# Altium footprint library THT_CON.PcbLib: 48 footprints (part 3 of 3)
Each footprint in its own frame and in the unit in brackets; x right, y up, seen from the top. Pads: shape width x height; smd on the part's side, far side on the other; paste and mask are expansions set on the pad; w line width, h text height; cw(c..) or ccw(c..) is an arc to the next point about the centre after c.
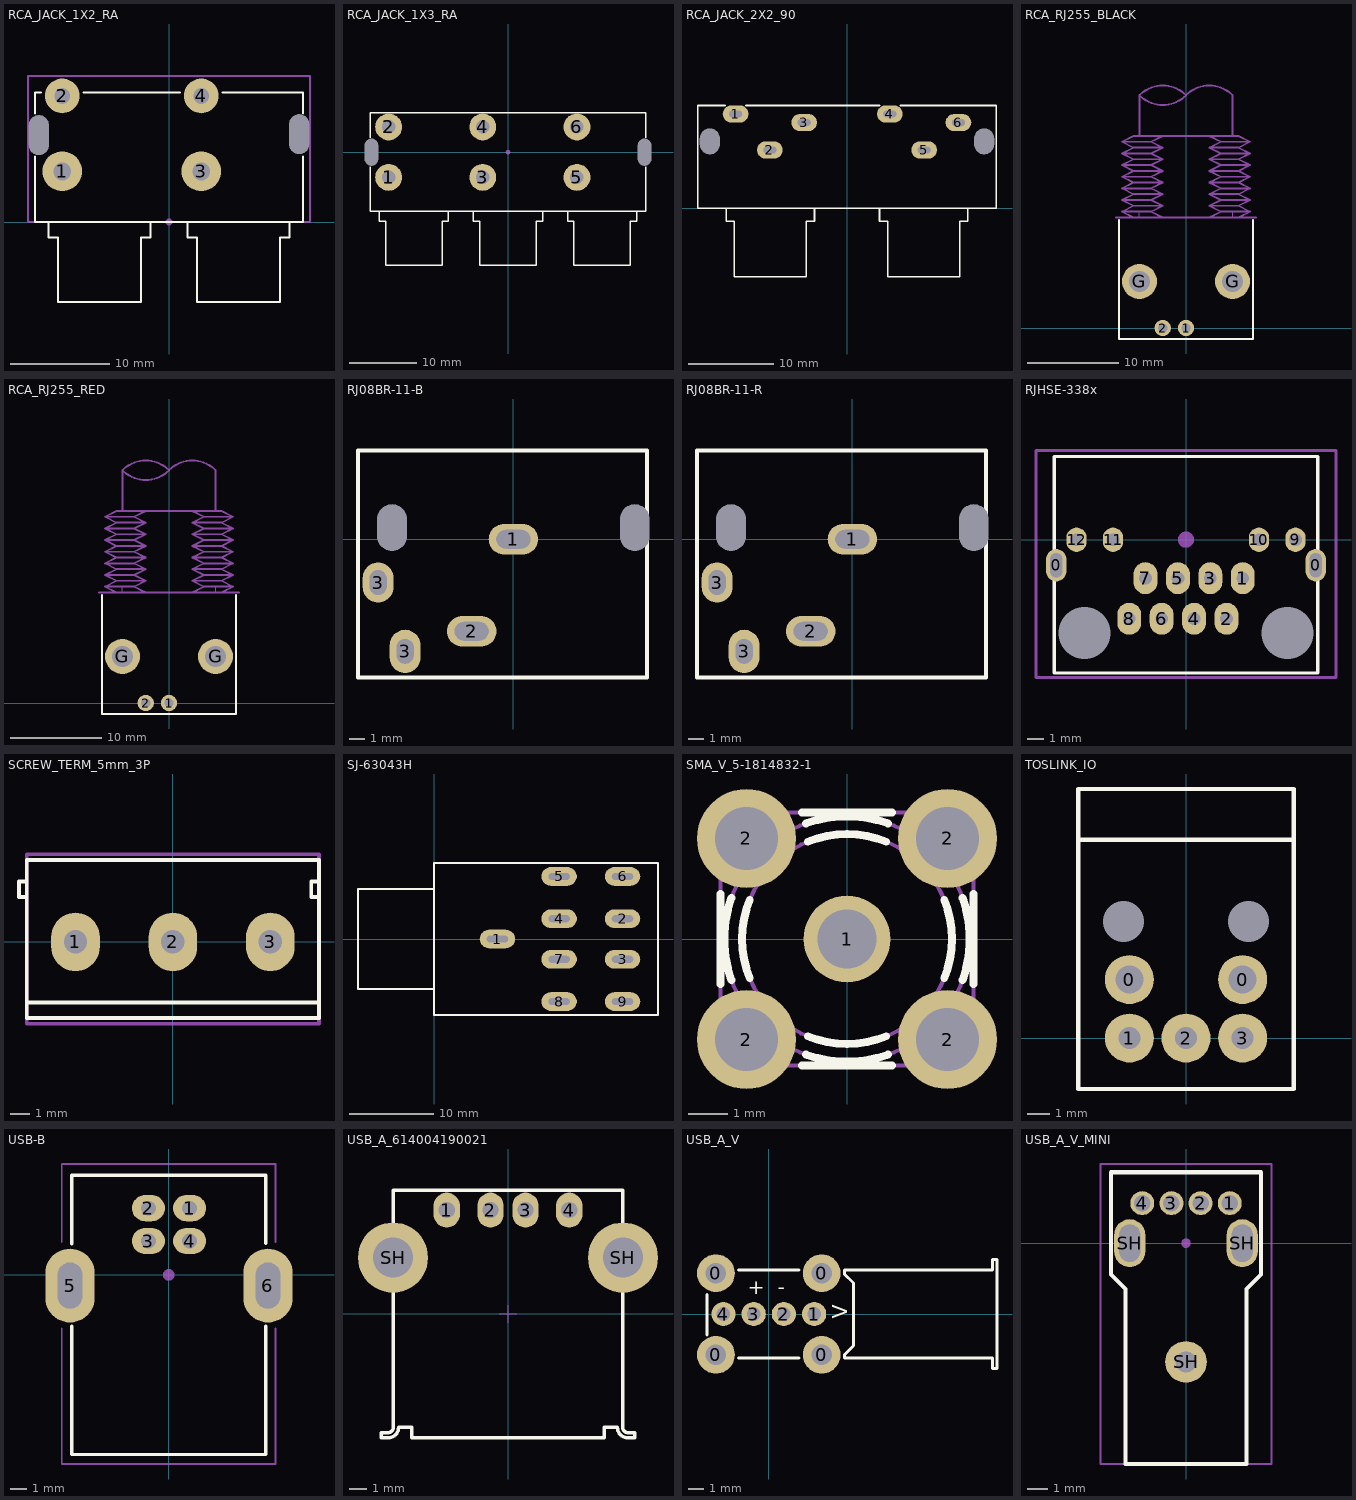
[diagram p2: the footprints below, top view; thin cyan lines are the x and y axes]

## RCA_JACK_1X2_RA [mm]
pads (6):
  round 4 hole 1.8: 1(-10.75,5.1) 3(3.25,5.1)
  round 3.5 hole 1.6: 2(-10.75,12.7) 4(3.25,12.7)
  round 0 hole 2 slot 4 at 90 deg unplated: 34(-13.1,8.75) 34(13.1,8.85)
Top Overlay:
  lines w0.2: -13.5,6.6 -13.5,0 13.5,0 13.5,6.6 ; -13.5,10.9 -13.5,13.05 -12.9,13.05 ; -12.15,-0.05 -12.15,-1.55 -11.192,-1.55 -11.192,-8.05 -2.808,-8.05 -2.808,-1.55 -1.85,-1.55 -1.85,-0.05 ; -8.6,13.05 1.1,13.05 ; 1.85,-0.05 1.85,-1.55 2.808,-1.55 2.808,-8.05 11.192,-8.05 11.192,-1.55 12.15,-1.55 12.15,-0.05 ; 5.4,13.05 13.5,13.05 13.5,10.9
Mechanical 15:
  circle w0.4: c0,0 r0.141
  lines w0.2: -0.141,0 14.2,0 14.2,14.7 -14.2,14.7 -14.2,0 0.141,0
3D body "AV2-8.4-14.STEP": height 16.75, standoff -4.5, extent -13.5,-7.975 13.5,13.025

## RCA_JACK_1X3_RA [mm]
pads (8):
  round 4 hole 2: 1(-17.75,-3.75) 2(-17.75,3.75) 3(-3.75,-3.75) 4(-3.75,3.75) 5(10.25,-3.75) 6(10.25,3.75)
  round 0 hole 2 slot 4 at 90 deg unplated: 34(-20.3,0) 34(20.3,0)
Top Overlay:
  lines w0.2: -20.5,-2.15 -20.5,-8.75 20.5,-8.75 20.5,-2.15 ; -20.5,2.15 -20.5,5.85 20.5,5.85 20.5,2.15 ; -19.15,-8.8 -19.15,-10.3 -18.192,-10.3 -18.192,-16.8 -9.808,-16.8 -9.808,-10.3 -8.85,-10.3 -8.85,-8.8 ; -5.15,-8.8 -5.15,-10.3 -4.192,-10.3 -4.192,-16.8 4.192,-16.8 4.192,-10.3 5.15,-10.3 5.15,-8.8 ; 8.85,-8.8 8.85,-10.3 9.808,-10.3 9.808,-16.8 18.192,-16.8 18.192,-10.3 19.15,-10.3 19.15,-8.8
Mechanical 15:
  circle w0.4: c0,0 r0.141
3D body "CON_RCA_3_PIN_white.STEP": height 16.5, standoff -4, extent -20.5,-16.85 20.5,5.85

## RCA_JACK_2X2_90 [mm] "RS-409, PSG01551 and similar"
pads (8):
  round 0 hole 2.3 slot 3 at 90 deg: 0(-16,7.8) 0(16,7.8)
  oval 3x2 hole 0.8 slot 1.5 at 0 deg: 1(-13,11) 2(-9,6.8) 3(-5,10) 4(5,11) 5(9,6.8) 6(13,10)
Top Overlay:
  lines w0.2: -14.2,12 -17.4,12 -17.4,0 17.4,0 17.4,12 6.2,12 ; -14.1,0 -14.1,-1.5 -13.142,-1.5 -13.142,-8 -4.758,-8 -4.758,-1.5 -3.8,-1.5 -3.8,0 ; -11.8,12 3.8,12 ; 3.8,0 3.8,-1.5 4.758,-1.5 4.758,-8 13.142,-8 13.142,-1.5 14.1,-1.5 14.1,0
3D body "RS-409-gold.step": height 27.2, standoff -4.8, extent -17.4,-8 17.4,12

## RCA_RJ255_BLACK [mil]
height 31.5
pads (4):
  round 70 hole 40: 1(0,0) 2(-100,0)
  round 150 hole 90: G(-200,200) G(200,200)
Top Overlay:
  lines w7.87: -287.4,464.57 -287.4,-47.24 287.4,-47.24 287.4,464.57
Mechanical 15:
  lines w4: -300,475 -100,475 ; -200,475 -200,500 ; -125,475 300,475 ; 200,475 200,500
  lines w8: -300,475 300,475 ; -225,475 -275,500 ; -200.17,999.83 ccw(c-100,1100) 0.17,999.83 ; -200.17,1000.17 cw(c-100,900) 0.17,1000.17 ; -200,825 -200,1000 ; -100,475 -150,500 ; -0.17,1000.17 cw(c100,900) 200.17,1000.17 ; 100,475 150,500 ; 200,825 200,1000 ; 225,475 275,500 ; -275,500 -225,525 ; -275,500 -150,500 ; -275,550 -225,525 ; -275,550 -225,575 ; -275,550 -150,550 ; -275,600 -225,575 ; -275,600 -225,625 ; -275,600 -150,600 ; -275,650 -225,625 ; -275,650 -225,675 ; -275,650 -150,650 ; -275,700 -225,675 ; -275,700 -225,725 ; -275,700 -150,700 ; -275,750 -225,725 ; -275,750 -225,775 ; -275,750 -150,750 ; -275,800 -225,775 ; -275,800 -225,825 ; -275,800 -150,800 ; -225,525 -100,525 ; -225,575 -100,575 ; -225,625 -100,625 ; -225,675 -100,675 ; -225,725 -100,725 ; -225,775 -100,775 ; -225,825 225,825 ; -225,825 -100,825 -150,800 ; -150,500 -100,525 ; -150,550 -100,525 ; -150,550 -100,575 ; -150,600 -100,575 ; -150,600 -100,625 ; -150,650 -100,625 ; -150,650 -100,675 ; -150,700 -100,675 ; -150,700 -100,725 ; -150,750 -100,725 ; -150,750 -100,775 ; -150,800 -100,775 ; 100,525 150,500 ; 100,525 150,550 ; 100,525 225,525 ; 100,575 150,550 ; 100,575 150,600 ; 100,575 225,575 ; 100,625 150,600 ; 100,625 150,650 ; 100,625 225,625 ; 100,675 150,650 ; 100,675 150,700 ; 100,675 225,675 ; 100,725 150,700 ; 100,725 150,750 ; 100,725 225,725 ; 100,775 150,750 ; 100,775 150,800 ; 100,775 225,775 ; 150,500 275,500 ; 150,550 275,550 ; 150,600 275,600 ; 150,650 275,650 ; 150,700 275,700 ; 150,750 275,750 ; 150,800 100,825 225,825 ; 150,800 275,800 ; 225,525 275,500 ; 225,525 275,550 ; 225,575 275,550 ; 225,575 275,600 ; 225,625 275,600 ; 225,625 275,650 ; 225,675 275,650 ; 225,675 275,700 ; 225,725 275,700 ; 225,725 275,750 ; 225,775 275,750 ; 225,775 275,800 ; 225,825 275,800
3D body "RCA_B1.STEP": height 586.61, standoff -188.98, extent -285.43,-47.24 285.43,1251.97

## RCA_RJ255_RED [mil]
height 31.5
pads (4):
  round 70 hole 40: 1(0,0) 2(-100,0)
  round 150 hole 90: G(-200,200) G(200,200)
Top Overlay:
  lines w7.87: -287.4,464.57 -287.4,-47.24 287.4,-47.24 287.4,464.57
Mechanical 15:
  lines w4: -300,475 -100,475 ; -200,475 -200,500 ; -125,475 300,475 ; 200,475 200,500
  lines w8: -300,475 300,475 ; -225,475 -275,500 ; -200.17,999.83 ccw(c-100,1100) 0.17,999.83 ; -200.17,1000.17 cw(c-100,900) 0.17,1000.17 ; -200,825 -200,1000 ; -100,475 -150,500 ; -0.17,1000.17 cw(c100,900) 200.17,1000.17 ; 100,475 150,500 ; 200,825 200,1000 ; 225,475 275,500 ; -275,500 -225,525 ; -275,500 -150,500 ; -275,550 -225,525 ; -275,550 -225,575 ; -275,550 -150,550 ; -275,600 -225,575 ; -275,600 -225,625 ; -275,600 -150,600 ; -275,650 -225,625 ; -275,650 -225,675 ; -275,650 -150,650 ; -275,700 -225,675 ; -275,700 -225,725 ; -275,700 -150,700 ; -275,750 -225,725 ; -275,750 -225,775 ; -275,750 -150,750 ; -275,800 -225,775 ; -275,800 -225,825 ; -275,800 -150,800 ; -225,525 -100,525 ; -225,575 -100,575 ; -225,625 -100,625 ; -225,675 -100,675 ; -225,725 -100,725 ; -225,775 -100,775 ; -225,825 225,825 ; -225,825 -100,825 -150,800 ; -150,500 -100,525 ; -150,550 -100,525 ; -150,550 -100,575 ; -150,600 -100,575 ; -150,600 -100,625 ; -150,650 -100,625 ; -150,650 -100,675 ; -150,700 -100,675 ; -150,700 -100,725 ; -150,750 -100,725 ; -150,750 -100,775 ; -150,800 -100,775 ; 100,525 150,500 ; 100,525 150,550 ; 100,525 225,525 ; 100,575 150,550 ; 100,575 150,600 ; 100,575 225,575 ; 100,625 150,600 ; 100,625 150,650 ; 100,625 225,625 ; 100,675 150,650 ; 100,675 150,700 ; 100,675 225,675 ; 100,725 150,700 ; 100,725 150,750 ; 100,725 225,725 ; 100,775 150,750 ; 100,775 150,800 ; 100,775 225,775 ; 150,500 275,500 ; 150,550 275,550 ; 150,600 275,600 ; 150,650 275,650 ; 150,700 275,700 ; 150,750 275,750 ; 150,800 100,825 225,825 ; 150,800 275,800 ; 225,525 275,500 ; 225,525 275,550 ; 225,575 275,550 ; 225,575 275,600 ; 225,625 275,600 ; 225,625 275,650 ; 225,675 275,650 ; 225,675 275,700 ; 225,725 275,700 ; 225,725 275,750 ; 225,775 275,750 ; 225,775 275,800 ; 225,825 275,800
3D body "RCA_R1.STEP": height 586.61, standoff -188.98, extent -285.43,-47.24 285.43,1251.97

## RJ08BR-11-B [mm]
pads (6):
  round 0 hole 1.9 slot 3 at 90 deg unplated: 0(-7.85,0.75) 0(7.85,0.75)
  oval 3.2x2 hole 1.2 slot 2.2 at 0 deg: 1(0,0) 2(-2.7,-5.95)
  oval 2x2.6 hole 1.1 slot 1.6 at 90 deg: 3(-8.75,-2.8)
  oval 2x2.8 hole 1.1 slot 1.6 at 90 deg: 3(-7,-7.25)
Top Overlay:
  lines w0.254: -10.05,-8.95 -10.05,5.75 8.65,5.75 8.65,-8.95 -10.05,-8.95
3D body "AV1-8.4-8B_black.STEP": height 22.35, standoff -4.5, extent -10.4,-7.725 8.75,15.225

## RJ08BR-11-R [mm]
height 2.38
pads (6):
  round 0 hole 1.9 slot 3 at 90 deg unplated: 0(-7.85,0.75) 0(7.85,0.75)
  oval 3.2x2 hole 1.2 slot 2.2 at 0 deg: 1(0,0) 2(-2.7,-5.95)
  oval 2x2.6 hole 1.1 slot 1.6 at 90 deg: 3(-8.75,-2.8)
  oval 2x2.8 hole 1.1 slot 1.6 at 90 deg: 3(-7,-7.25)
Top Overlay:
  lines w0.254: -10.05,-8.95 8.65,-8.95 8.65,5.75 -10.05,5.75 -10.05,-8.95
3D body "AV1-8.4-8B_red.STEP": height 22.35, standoff -4.5, extent -10.4,-7.725 8.75,15.225

## RJHSE-338x [mil]
pads (16):
  oval 50x80 hole 30 slot 60 at 90 deg: 0(-320,-63) 0(320,-63)
  oval 59.06x78.74 hole 31.5: 1(140,-95) 2(100,-195) 3(60,-95) 4(20,-195) 5(-20,-95) 6(-60,-195) 7(-100,-95) 8(-140,-195)
  oval 50x60 hole 31.5: 9(270,0) 10(180,0) 11(-180,0) 12(-270,0)
  round 0 hole 128 unplated: NC(-250,-230) NC(250,-230)
Top Overlay:
  lines w7.87: -325,-329 325,-329 325,205 -325,205 -325,-329
Mechanical 15:
  circle w19.68: c0,0 r10
  lines w7.87: -370,-340 370,-340 370,220 -370,220 -370,-340
3D body "M-RJHSE-338X-REVT3.STEP": height 648.4, standoff -141.48, extent -360.04,-329.53 359.96,204.47

## SCREW_TERM_5mm_3P [mm]
pads (3):
  oval 2.5x3 hole 1.2: 1(-5,0) 2(0,0) 3(5,0)
Top Overlay:
  lines w0.2: -7.5,-3.1 7.5,-3.1 ; -7.5,2.3 -7.9,2.3 -7.9,3.1 -7.5,3.1 ; 7.5,2.3 7.1,2.3 7.1,3.1 7.5,3.1 ; -7.5,-3.9 7.5,-3.9 7.5,4.2 -7.5,4.2 -7.5,-3.9
Mechanical 15:
  lines w0.2: -7.5,-4.2 7.5,-4.2 7.5,4.5 -7.5,4.5 -7.5,-4.2
3D body "User Library-WJ127-5_0-3P.step": height 10.2, standoff -2.9, extent -7.5,-3.9 7.5,4.2

## SJ-63043H [mm]
pads (9):
  oval 4.2x2.2 hole 0.8 slot 2.5 at 0 deg mask+0.1: 1(7.5,0) 2(22.3,2.4) 3(22.3,-2.4) 5(14.8,7.4) 6(22.3,7.4) 8(14.8,-7.4) 9(22.3,-7.4)
  oval 4.2x2.2 hole 0.8 slot 2.5 at 0 deg paste-2539.97 mask+0.1: 4(14.8,2.4) 7(14.8,-2.4)
Top Overlay:
  lines w0.254: -9,-5.9 -9,5.9 0,5.9 0,-5.9 -9,-5.9 ; 0,-9 26.5,-9 26.5,9 0,9 0,-9
3D body "CUI_DEVICES_SJ-63043H.step": height 12.46, standoff -4.04, extent -8.994,-9 26.506,9

## SMA_V_5-1814832-1 [mm] "50 Ohm SMA Straight PCB Die Socket"
height 13.5
pads (5):
  round 2.2 hole 1.5: 1(0,0)
  round 2.5 hole 1.6: 2(-2.54,-2.54) 2(-2.54,2.54) 2(2.54,-2.54) 2(2.54,2.54)
Top Overlay:
  lines w0.2: -3.2,-1.138 -3.2,1.138 ; -2.921,-1.038 cw(c0,0) -2.921,1.038 ; -2.457,-0.992 cw(c0,0) -2.457,0.992 ; -1.138,-3.2 1.138,-3.2 ; -1.138,3.2 1.138,3.2 ; -1.038,-2.921 ccw(c0,0) 1.038,-2.921 ; -1.038,2.921 cw(c0,0) 1.038,2.921 ; -0.992,-2.457 ccw(c0,0) 0.992,-2.457 ; -0.992,2.457 cw(c0,0) 0.992,2.457 ; 2.457,-0.992 ccw(c0,0) 2.457,0.992 ; 2.921,-1.038 ccw(c0,0) 2.921,1.038 ; 3.2,-1.138 3.2,1.138
Mechanical 8:
  lines w0.1: -3.54,-2.54 -2.54,-2.54 ; -3.54,2.54 -2.54,2.54 ; -2.54,-3.54 -2.54,-2.54 ; -2.54,-1.54 -2.54,-2.54 ; -2.54,1.54 -2.54,2.54 ; -2.54,3.54 -2.54,2.54 ; -1.54,-2.54 -2.54,-2.54 ; -1.54,2.54 -2.54,2.54 ; -1,0 0,0 ; 0,-1 0,0 ; 0,1 0,0 ; 1,0 0,0 ; 1.54,-2.54 2.54,-2.54 ; 1.54,2.54 2.54,2.54 ; 2.54,-3.54 2.54,-2.54 ; 2.54,-1.54 2.54,-2.54 ; 2.54,1.54 2.54,2.54 ; 2.54,3.54 2.54,2.54 ; 3.54,-2.54 2.54,-2.54 ; 3.54,2.54 2.54,2.54
Mechanical 14:
  circle w0.1: c0,0 r3.1
  circle w0.1: c0,0 r2.65
  circle w0.1: c0,0 r0.5
  lines w0.1: -3.2,-2.797 -3.2,2.797 -2.797,3.2 2.797,3.2 3.2,2.797 3.2,-2.797 2.797,-3.2 -2.797,-3.2 -3.2,-2.797
3D body "TYCO_5-1814832-1.stp": height 9.5, standoff -4, extent -3.2,-3.2 3.2,3.2

## TOSLINK_IO [mm]
pads (7):
  round 0.203 hole 1.85: 0(-2.8,5.235) 0(2.8,5.235)
  round 2.2 hole 1.25: 0(-2.54,2.625) 0(2.54,2.625)
  round 2.2 hole 1: 1(-2.54,0) 2(0,0) 3(2.54,0)
Top Overlay:
  lines w0.2: -4.826,8.89 -4.826,-2.286 4.826,-2.286 4.826,8.89 ; -4.826,8.89 4.826,8.89 ; -4.826,8.89 -4.826,11.176 4.826,11.176 4.826,8.89
3D body "User Library-TORX147PL(f,t).SLDPRT": height 10.15, standoff -3.45, extent -4.85,-2.324 4.85,11.176

## USB-B [mm]
height 2.38
pads (6):
  oval 2x1.6 hole 0.889: 1(1.27,4.064) 2(-1.23,4.064) 3(-1.23,2.064) 4(1.27,2.064)
  oval 3x4.5 hole 1.5 slot 2.8 at 90 deg: 5(-6,-0.646) 6(6.04,-0.646)
Top Overlay:
  lines w0.2: -5.9,-3.1 -5.9,-10.926 5.9,-10.926 5.9,-3.1 ; -5.9,1.9 -5.9,6.074 5.9,6.074 5.9,1.916
Mechanical 15:
  circle w0.4: c0,0 r0.151
  lines w0.1: -6.5,-3.25 -6.5,-11.5 6.5,-11.5 6.5,-3.25 ; -6.5,2 -6.5,6.75 6.5,6.75 6.5,2
3D body "670688000.stp": height 11.09, standoff -4.13, extent -7.43,-10.917 7.43,6.083

## USB_A_614004190021 [mm] "USB 2.0 Type A Horizontal THT"
height 6.9
pads (6):
  oval 1.5x2 hole 0.92: 1(-3.5,5.935) 2(-1,5.935) 3(1,5.935) 4(3.5,5.935)
  round 4 hole 2.3: SH(-6.57,3.225) SH(6.57,3.225)
Top Overlay:
  lines w0.2: -6.55,1.225 -6.55,-6.475 cw(c-6.85,-6.475) -6.85,-6.775 -7.25,-6.775 -7.25,-7.075 -6.85,-7.075 ccw(c-6.85,-6.475) -6.25,-6.475 -5.5,-6.475 -5.5,-7.075 5.5,-7.075 5.5,-6.475 6.25,-6.475 ccw(c6.85,-6.475) 6.85,-7.075 7.25,-7.075 7.25,-6.775 6.85,-6.775 cw(c6.85,-6.475) 6.55,-6.475 6.55,1.225 ; -6.55,5.225 -6.55,7.075 6.55,7.075 6.55,5.225
Mechanical 13:
  lines w0.1: -7.25,-7.075 -7.25,-6.775 -6.85,-6.775 ccw(c-6.85,-6.475) -6.55,-6.475 -6.55,7.075 6.55,7.075 6.55,-6.475 ccw(c6.85,-6.475) 6.85,-6.775 7.25,-6.775 7.25,-7.075 6.85,-7.075 cw(c6.85,-6.475) 6.25,-6.475 5.5,-6.475 5.5,-7.075 -5.5,-7.075 -5.5,-6.475 -6.25,-6.475 cw(c-6.85,-6.475) -6.85,-7.075 -7.25,-7.075
Mechanical 15:
  lines w0.05: -0.5,0 0.5,0 ; 0,-0.5 0,0.5
3D body "614004190021.stp": height 7.73, standoff -3.67, extent -7.85,-7.075 7.85,7.075

## USB_A_V [mm]
height 0.8
pads (8):
  round 2.5 hole 1.35: 0(-3.5,-2.7) 0(-3.5,2.7) 0(3.5,-2.7) 0(3.5,2.7)
  round 1.6 / inner round 1.6 / far side oval 1.6x2 hole 0.9: 1(3,0) 2(1,0) 3(-1,0) 4(-3,0)
Top Overlay:
  lines w0.2: -4.1,-1.4 -4.1,1.3 ; -2,-2.9 2,-2.9 ; -2,2.9 2,2.9 ; 5,2.65 5,2.9 14.794,2.9 14.794,3.6 15.1,3.6 15.1,2.9 15.1,-2.9 15.1,-3.6 14.794,-3.6 14.794,-2.9 5.011,-2.9 5.011,-2.689 5.6,-2.1 5.6,2.05 5,2.65
  text "V" at 5.2,-0.3 h1
  text "-" at 0.6,1.3 h1
  text "+" at -1.4,1.3 h1
3D body "usb_a-usb_a-e.stp": height 14.45, standoff -3.96, extent -4.1,-3.599 15.1,3.599

## USB_A_V_MINI [mm]
pads (7):
  round 1.15 hole 0.8: 1(2.1,1.92) 2(0.7,1.92) 3(-0.7,1.92) 4(-2.1,1.92)
  oval 1.5x2.3 hole 1 slot 1.8 at 90 deg: SH(-2.7,0) SH(2.7,0)
  round 2 hole 1: SH(0,-5.7)
Top Overlay:
  lines w0.2: -3.6,-1.5 -2.9,-2.2 -2.9,-9.4 -2.9,-10.6 2.9,-10.6 2.9,-9.4 2.9,-2.2 3.6,-1.5 3.6,3.4 -3.6,3.4 -3.6,-1.5
Mechanical 15:
  circle w0.254: c0,0 r0.1
  lines w0.1: -4.1,-10.6 4.1,-10.6 4.1,3.8 -4.1,3.8 -4.1,-10.6
3D body "GSB191111K1H9HR--3DModel-STEP-554624.STEP": height 13.86, standoff -4.3, extent -4.11,-10.65 4.11,4.05